# Altium footprint library SOURIAU THD.PcbLib: 34 footprints (part 4 of 5)
Each footprint in its own frame and in the unit in brackets; x right, y up, seen from the top. Pads: shape width x height; smd on the part's side, far side on the other; paste and mask are expansions set on the pad; w line width, h text height; cw(c..) or ccw(c..) is an arc to the next point about the centre after c.
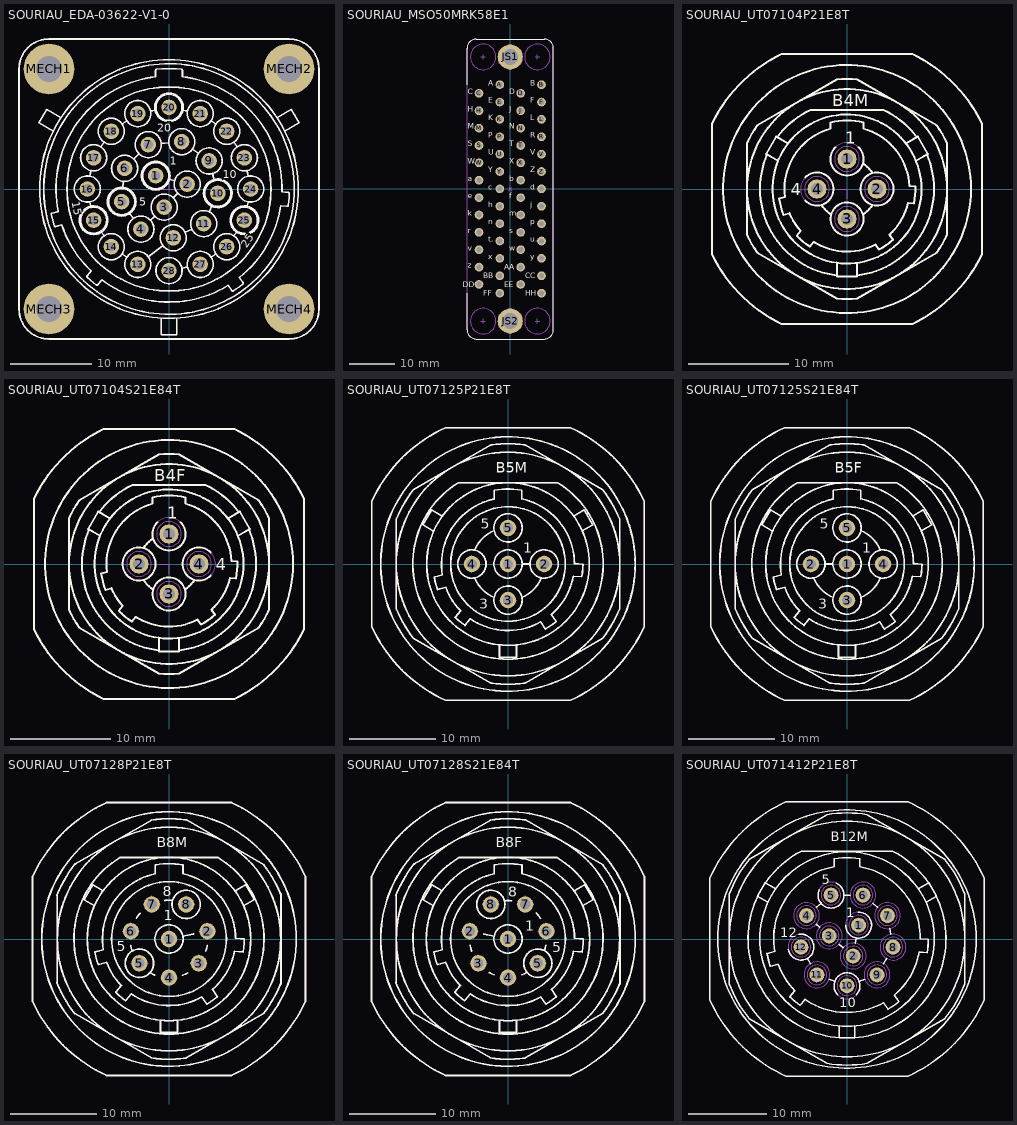
[diagram p3: the footprints below, top view; thin cyan lines are the x and y axes]

## SOURIAU_EDA-03622-V1-0 [mm] "Adapter Kit For PCB Mount For SOURIAU UTG02028P02, 28 Poles, Shell Size 20, Metalok Bantam Circular Male Connecteur"
height 37.35
pads (32):
  round 1.9 hole 1.2: 1(-1.626,1.626) 2(2.222,0.595) 3(-0.595,-2.222) 4(-3.441,-4.915) 5(-5.796,-1.553) 6(-5.438,2.536) 7(-2.536,5.438) 8(1.553,5.796) 9(4.915,3.441) 10(5.977,-0.523) 11(4.243,-4.243) 12(0.523,-5.977) 13(-3.827,-9.239) 14(-7.071,-7.071) 15(-9.239,-3.827) 16(-10,0) 17(-9.239,3.827) 18(-7.071,7.071) 19(-3.827,9.239) 20(0,10) 21(3.827,9.239) 22(7.071,7.071) 23(9.239,3.827) 24(10,0) 25(9.239,-3.827) 26(7.071,-7.071) 27(3.827,-9.239) 28(0,-10)
  round 6.2 hole 3.2: MECH1(-14.7,14.7) MECH2(14.7,14.7) MECH3(-14.7,-14.7) MECH4(14.7,-14.7)
Top Overlay:
  circle w0.2: c0,0 r15.85
  circle w0.2: c0,0 r15.35
  circle w0.2: c0,0 r12.5
  circle w0.2: c-3.827,-9.239 r1.6
  circle w0.2: c0,-10 r1.6
  circle w0.2: c3.827,-9.239 r1.6
  circle w0.2: c7.071,-7.071 r1.6
  circle w0.2: c10,0 r1.6
  circle w0.2: c9.239,3.827 r1.6
  circle w0.2: c7.071,7.071 r1.6
  circle w0.2: c3.827,9.239 r1.6
  circle w0.2: c0,10 r1.6
  circle w0.2: c-3.827,9.239 r1.6
  circle w0.2: c-7.071,7.071 r1.6
  circle w0.2: c-9.239,3.827 r1.6
  circle w0.2: c-10,0 r1.6
  circle w0.2: c-9.239,-3.827 r1.6
  circle w0.2: c-7.071,-7.071 r1.6
  circle w0.2: c0.523,-5.977 r1.6
  circle w0.2: c-3.441,-4.915 r1.6
  circle w0.2: c-5.796,-1.553 r1.6
  circle w0.2: c-5.438,2.536 r1.6
  circle w0.2: c-2.536,5.438 r1.6
  circle w0.2: c1.553,5.796 r1.6
  circle w0.2: c4.915,3.441 r1.6
  circle w0.2: c5.977,-0.523 r1.6
  circle w0.2: c4.243,-4.243 r1.6
  circle w0.2: c-0.595,-2.222 r1.6
  circle w0.2: c2.222,0.595 r1.6
  circle w0.2: c-1.626,1.626 r1.6
  circle w0.2: c-1.626,1.626 r1.75
  circle w0.2: c-5.796,-1.553 r1.75
  lines w0.2: -14.175,7.093 -15.931,8.107 -14.986,9.743 -13.23,8.729 ; -10.849,-3.142 ccw(c-9.239,-3.827) -10.452,-2.566 ; -9.688,-1.569 -9.58,-2.11 ; -9.688,1.569 -9.551,2.258 ; -8.35,5.157 -7.96,5.741 ; -8.267,-5.282 -7.96,-5.741 ; -5.741,-7.96 -5.157,-8.35 ; -5.741,7.96 -5.157,8.35 ; -5.643,0.19 -5.577,0.942 ; -4.792,-2.986 -4.359,-3.604 ; -4.306,3.667 -3.667,4.306 ; -2.547,-8.279 -0.757,-6.937 ; -2.279,-3.815 -1.757,-3.321 ; -2.258,9.551 -1.716,9.659 ; -0.945,-15.822 -0.945,-17.85 0.945,-17.85 0.945,-15.822 ; -0.942,5.577 -0.041,5.656 ; -0.357,8.287 cw(c0,10) 0.357,8.287 ; 0.064,1.173 0.676,1.009 ; 0.536,-1.09 1.09,-0.536 ; 1.569,-9.688 2.258,-9.551 ; 1.716,9.659 2.258,9.551 ; 1.973,-5.301 2.793,-4.919 ; 2.864,4.878 3.604,4.359 ; 4.919,-2.793 5.301,-1.973 ; 5.157,-8.35 5.741,-7.96 ; 5.157,8.35 5.741,7.96 ; 5.329,1.896 5.563,1.023 ; 6.363,1.184 ccw(c5.977,-0.523) 6.712,1.065 ; 7.96,-5.741 8.267,-5.282 ; 7.96,5.741 8.35,5.157 ; 9.205,-5.577 cw(c9.239,-3.827) 9.997,-5.404 ; 9.307,-5.425 cw(c9.239,-3.827) 9.85,-5.305 ; 9.551,2.258 9.688,1.569 ; 9.58,-2.11 9.688,-1.569 ; 13.23,8.729 14.986,9.743 15.931,8.107 14.175,7.093 ; -18.375,-14.7 ccw(c-14.7,-14.7) -14.7,-18.375 14.7,-18.375 ccw(c14.7,-14.7) 18.375,-14.7 18.375,14.7 ccw(c14.7,14.7) 14.7,18.375 -14.7,18.375 ccw(c-14.7,14.7) -18.375,14.7 -18.375,-14.7 ; -14.414,-3.13 ccw(c0,0) -14.048,-4.496 ccw(c-13.905,-4.451) -13.866,-4.595 -13.133,-4.399 ccw(c0,0) -9.537,-10.043 -10.025,-10.625 ccw(c-9.91,-10.721) -10.012,-10.832 ccw(c0,0) -8.928,-11.741 ccw(c-8.838,-11.621) -8.723,-11.718 -8.235,-11.136 ccw(c0,0) 7.233,-11.811 7.668,-12.433 ccw(c7.791,-12.347) 7.871,-12.474 ccw(c0,0) 9.03,-11.663 ccw(c8.938,-11.544) 9.061,-11.458 8.625,-10.836 ccw(c0,0) 13.697,-2.052 14.454,-2.118 ccw(c14.467,-1.968) 14.615,-1.989 ccw(c0,0) 14.739,-0.58 ccw(c14.589,-0.574) 14.602,-0.424 13.845,-0.358 ccw(c0,0) 1.65,13.751 1.65,14.523 ccw(c1.5,14.523) 1.515,14.672 ccw(c0,0) -1.515,14.672 ccw(c-1.5,14.523) -1.65,14.523 -1.65,13.751 ccw(c0,0) -13.573,-2.757 -14.306,-2.953 ccw(c-14.267,-3.098) -14.414,-3.13
  text "1" at 0.093,2.965 h1
  text "10" at 6.613,1.315 h1
  text "5" at -3.629,-2.053 h1
  text "20" at -1.47,7.037 h1
  text "15" at -11.906,-1.638 h1
  text "25" at 9.524,-7.34 h1
Mechanical 8:
  circle w0.1: c-14.7,14.7 r1.6
  circle w0.1: c14.7,14.7 r1.6
  circle w0.1: c14.7,-14.7 r1.6
  circle w0.1: c-14.7,-14.7 r1.6
  lines w0.1: -15.2,-14.7 -14.7,-14.7 ; -15.2,14.7 -14.7,14.7 ; -14.7,-15.2 -14.7,-14.7 ; -14.7,-14.2 -14.7,-14.7 ; -14.7,14.2 -14.7,14.7 ; -14.7,15.2 -14.7,14.7 ; -14.2,-14.7 -14.7,-14.7 ; -14.2,14.7 -14.7,14.7 ; -10.5,0 -10,0 ; -10,-0.5 -10,0 ; -10,0.5 -10,0 ; -9.739,-3.827 -9.239,-3.827 ; -9.739,3.827 -9.239,3.827 ; -9.5,0 -10,0 ; -9.239,-4.327 -9.239,-3.827 ; -9.239,-3.327 -9.239,-3.827 ; -9.239,3.327 -9.239,3.827 ; -9.239,4.327 -9.239,3.827 ; -8.739,-3.827 -9.239,-3.827 ; -8.739,3.827 -9.239,3.827 ; -7.571,-7.071 -7.071,-7.071 ; -7.571,7.071 -7.071,7.071 ; -7.071,-7.571 -7.071,-7.071 ; -7.071,-6.571 -7.071,-7.071 ; -7.071,6.571 -7.071,7.071 ; -7.071,7.571 -7.071,7.071 ; -6.571,-7.071 -7.071,-7.071 ; -6.571,7.071 -7.071,7.071 ; -6.296,-1.553 -5.796,-1.553 ; -5.938,2.536 -5.438,2.536 ; -5.796,-2.053 -5.796,-1.553 ; -5.796,-1.053 -5.796,-1.553 ; -5.438,2.036 -5.438,2.536 ; -5.438,3.036 -5.438,2.536 ; -5.296,-1.553 -5.796,-1.553 ; -4.938,2.536 -5.438,2.536 ; -4.327,-9.239 -3.827,-9.239 ; -4.327,9.239 -3.827,9.239 ; -3.941,-4.915 -3.441,-4.915 ; -3.827,-9.739 -3.827,-9.239 ; -3.827,-8.739 -3.827,-9.239 ; -3.827,8.739 -3.827,9.239 ; -3.827,9.739 -3.827,9.239 ; -3.441,-5.415 -3.441,-4.915 ; -3.441,-4.415 -3.441,-4.915 ; -3.327,-9.239 -3.827,-9.239 ; -3.327,9.239 -3.827,9.239 ; -3.036,5.438 -2.536,5.438 ; -2.941,-4.915 -3.441,-4.915 ; -2.536,4.938 -2.536,5.438 ; -2.536,5.938 -2.536,5.438 ; -2.126,1.626 -1.626,1.626 ; -2.036,5.438 -2.536,5.438 ; -1.626,1.126 -1.626,1.626 ; -1.626,2.126 -1.626,1.626 ; -1.126,1.626 -1.626,1.626 ; -1.095,-2.222 -0.595,-2.222 ; -1,0 0,0 ; -0.595,-2.722 -0.595,-2.222 ; -0.595,-1.722 -0.595,-2.222 ; -0.5,-10 0,-10 ; -0.5,10 0,10 ; -0.095,-2.222 -0.595,-2.222 ; 0,-10.5 0,-10 ; 0,-9.5 0,-10 ; 0,1 0,0 ; 0,9.5 0,10 ; 0,10.5 0,10 ; 0.023,-5.977 0.523,-5.977 ; 0.5,-10 0,-10 ; 0.5,10 0,10 ; 0.523,-6.477 0.523,-5.977 ; 0.523,-5.477 0.523,-5.977 ; 1,0 0,0 ; 1.023,-5.977 0.523,-5.977 ; 1.053,5.796 1.553,5.796 ; 1.553,5.296 1.553,5.796 ; 1.553,6.296 1.553,5.796 ; 1.722,0.595 2.222,0.595 ; 2.053,5.796 1.553,5.796 ; 2.222,0.095 2.222,0.595 ; 2.222,1.095 2.222,0.595 ; 2.722,0.595 2.222,0.595 ; 3.327,-9.239 3.827,-9.239 ; 3.327,9.239 3.827,9.239 ; 3.743,-4.243 4.243,-4.243 ; 3.827,-9.739 3.827,-9.239 ; 3.827,-8.739 3.827,-9.239 ; 3.827,8.739 3.827,9.239 ; 3.827,9.739 3.827,9.239 ; 4.243,-4.743 4.243,-4.243 ; 4.243,-3.743 4.243,-4.243 ; 4.327,-9.239 3.827,-9.239 ; 4.327,9.239 3.827,9.239 ; 4.415,3.441 4.915,3.441 ; 4.743,-4.243 4.243,-4.243 ; 4.915,2.941 4.915,3.441 ; 4.915,3.941 4.915,3.441 ; 5.415,3.441 4.915,3.441 ; 5.477,-0.523 5.977,-0.523 ; 5.977,-1.023 5.977,-0.523 ; 5.977,-0.023 5.977,-0.523 ; 6.477,-0.523 5.977,-0.523 ; 6.571,-7.071 7.071,-7.071 ; 6.571,7.071 7.071,7.071 ; 7.071,-7.571 7.071,-7.071 ; 7.071,-6.571 7.071,-7.071 ; 7.071,6.571 7.071,7.071 ; 7.071,7.571 7.071,7.071 ; 7.571,-7.071 7.071,-7.071 ; 7.571,7.071 7.071,7.071 ; 8.739,-3.827 9.239,-3.827 ; 8.739,3.827 9.239,3.827 ; 9.239,-4.327 9.239,-3.827 ; 9.239,-3.327 9.239,-3.827 ; 9.239,3.327 9.239,3.827 ; 9.239,4.327 9.239,3.827 ; 9.5,0 10,0 ; 9.739,-3.827 9.239,-3.827 ; 9.739,3.827 9.239,3.827 ; 10,-0.5 10,0 ; 10,0.5 10,0 ; 10.5,0 10,0 ; 14.2,-14.7 14.7,-14.7 ; 14.2,14.7 14.7,14.7 ; 14.7,-15.2 14.7,-14.7 ; 14.7,-14.2 14.7,-14.7 ; 14.7,14.2 14.7,14.7 ; 14.7,15.2 14.7,14.7 ; 15.2,-14.7 14.7,-14.7 ; 15.2,14.7 14.7,14.7
Mechanical 14:
  drawing of 167 lines, arcs and shapes, not listed
  text "1" at 0.093,2.965 h1
  text "10" at 6.613,1.315 h1
  text "5" at -3.629,-2.053 h1
  text "20" at -1.47,7.037 h1
  text "15" at -11.906,-1.638 h1
  text "25" at 9.524,-7.34 h1
3D body "SOURIAU_EDA-03622-V1-0.stp": height 37, standoff -13.8, extent -18.375,-18.375 18.375,18.375

## SOURIAU_MSO50MRK58E1 [mm] "Straight Rectangular Boardmount Receptacle with Jackscrew Hardware, MSO Series"
height 13
pads (52):
  round 1.9 hole 1.2: A(-2.285,22.86) a.(-6.855,1.905) AA(2.285,-17.145) B(6.855,22.86) b.(2.285,1.905) BB(-2.285,-19.05) C(-6.855,20.955) c.(-2.285,0) CC(6.855,-19.05) D(2.285,20.955) d.(6.855,0) DD(-6.855,-20.955) E(-2.285,19.05) e.(-6.855,-1.905) EE(2.285,-20.955) F(6.855,19.05) f.(2.285,-1.905) FF(-2.285,-22.86) H(-6.855,17.145) h.(-2.285,-3.81) HH(6.855,-22.86) J(2.285,17.145) j.(6.855,-3.81) K(-2.285,15.24) k.(-6.855,-5.715) L(6.855,15.24) M(-6.855,13.335) m.(2.285,-5.715) N(2.285,13.335) n.(-2.285,-7.62) P(-2.285,11.43) p.(6.855,-7.62) R(6.855,11.43) r.(-6.855,-9.525) S(-6.855,9.525) s.(2.285,-9.525) T(2.285,9.525) t.(-2.285,-11.43) U(-2.285,7.62) u.(6.855,-11.43) V(6.855,7.62) v.(-6.855,-13.335) W(-6.855,5.715) w.(2.285,-13.335) X(2.285,5.715) x.(-2.285,-15.24) Y(-2.285,3.81) y.(6.855,-15.24) Z(6.855,3.81) z.(-6.855,-17.145)
  round 5.5 hole 3.5: JS1(0,28.955) JS2(0,-28.995)
Top Overlay:
  lines w0.2: -9.45,-22.86 -9.45,-30.92 ccw(c-7.45,-30.92) -7.45,-32.92 7.45,-32.92 ccw(c7.45,-30.92) 9.45,-30.92 9.45,30.88 ccw(c7.45,30.88) 7.45,32.88 -7.45,32.88 ccw(c-7.45,30.88) -9.45,30.88 -9.45,22.86
  text "HH" at 3.3,-23.42 h1.2
  text "EE" at -1.3,-21.53 h1.2
  text "FF" at -5.87,-23.435 h1.2
  text "DD" at -10.44,-21.53 h1.2
  text "CC" at 3.3,-19.625 h1.2
  text "BB" at -5.87,-19.625 h1.2
  text "AA" at -1.3,-17.72 h1.2
  text "z" at -9.345,-17.325 h1.2
  text "y" at 4.365,-15.42 h1.2
  text "x" at -4.775,-15.42 h1.2
  text "w" at -0.205,-13.515 h1.2
  text "v" at -9.345,-13.515 h1.2
  text "u." at 4.365,-11.61 h1.2
  text "t." at -4.775,-11.61 h1.2
  text "r" at -9.345,-9.705 h1.2
  text "A" at -4.775,22.68 h1.2
  text "B" at 4.365,22.68 h1.2
  text "C" at -9.345,20.775 h1.2
  text "D" at -0.205,20.775 h1.2
  text "E" at -4.775,18.87 h1.2
  text "F" at 4.365,18.87 h1.2
  text "H" at -9.345,16.965 h1.2
  text "J" at -0.205,16.965 h1.2
  text "K" at -4.775,15.06 h1.2
  text "L" at 4.365,15.06 h1.2
  text "M" at -9.345,13.155 h1.2
  text "N" at -0.205,13.155 h1.2
  text "P" at -4.775,11.25 h1.2
  text "R" at 4.365,11.25 h1.2
  text "S" at -9.345,9.345 h1.2
  text "T" at -0.205,9.345 h1.2
  text "U" at -4.775,7.44 h1.2
  text "V" at 4.365,7.44 h1.2
  text "W" at -9.345,5.535 h1.2
  text "X" at -0.205,5.535 h1.2
  text "Y" at -4.775,3.63 h1.2
  text "Z" at 4.365,3.63 h1.2
  text "a" at -9.345,1.725 h1.2
  text "b" at -0.205,1.725 h1.2
  text "c" at -4.775,-0.18 h1.2
  text "d" at 4.365,-0.18 h1.2
  text "e" at -9.345,-2.085 h1.2
  text "f" at -0.205,-2.085 h1.2
  text "h" at -4.775,-3.99 h1.2
  text "j" at 4.365,-3.99 h1.2
  text "k" at -9.345,-5.895 h1.2
  text "m" at -0.205,-5.895 h1.2
  text "n" at -4.775,-7.8 h1.2
  text "p" at 4.365,-7.8 h1.2
  text "s" at -0.205,-9.705 h1.2
Mechanical 8:
  drawing of 230 lines, arcs and shapes, not listed
  text "A" at -3.635,22.441 h0.84
Mechanical 14:
  circle w0.1: c-5.94,-28.995 r2.8
  circle w0.1: c5.94,-28.995 r2.8
  circle w0.1: c-5.94,28.955 r2.8
  circle w0.1: c5.94,28.955 r2.8
  lines w0.1: -9.45,-30.92 ccw(c-7.45,-30.92) -7.45,-32.92 7.45,-32.92 ccw(c7.45,-30.92) 9.45,-30.92 9.45,30.88 ccw(c7.45,30.88) 7.45,32.88 -7.45,32.88 ccw(c-7.45,30.88) -9.45,30.88 -9.45,-30.92 ; -2.425,-30.395 -2.425,-27.595 0,-26.195 2.425,-27.595 2.425,-30.395 0,-31.795 -2.425,-30.395 ; -2.425,27.555 -2.425,30.355 0,31.755 2.425,30.355 2.425,27.555 0,26.155 -2.425,27.555
  text "HH" at 3.3,-23.42 h1.2
  text "EE" at -1.3,-21.53 h1.2
  text "FF" at -5.87,-23.435 h1.2
  text "DD" at -10.44,-21.53 h1.2
  text "CC" at 3.3,-19.625 h1.2
  text "BB" at -5.87,-19.625 h1.2
  text "AA" at -1.3,-17.72 h1.2
  text "z" at -9.345,-17.325 h1.2
  text "y" at 4.365,-15.42 h1.2
  text "x" at -4.775,-15.42 h1.2
  text "w" at -0.205,-13.515 h1.2
  text "v" at -9.345,-13.515 h1.2
  text "u." at 4.365,-11.61 h1.2
  text "t." at -4.775,-11.61 h1.2
  text "r" at -9.345,-9.705 h1.2
  text "A" at -4.775,22.68 h1.2
  text "B" at 4.365,22.68 h1.2
  text "C" at -9.345,20.775 h1.2
  text "D" at -0.205,20.775 h1.2
  text "E" at -4.775,18.87 h1.2
  text "F" at 4.365,18.87 h1.2
  text "H" at -9.345,16.965 h1.2
  text "J" at -0.205,16.965 h1.2
  text "K" at -4.775,15.06 h1.2
  text "L" at 4.365,15.06 h1.2
  text "M" at -9.345,13.155 h1.2
  text "N" at -0.205,13.155 h1.2
  text "P" at -4.775,11.25 h1.2
  text "R" at 4.365,11.25 h1.2
  text "S" at -9.345,9.345 h1.2
  text "T" at -0.205,9.345 h1.2
  text "U" at -4.775,7.44 h1.2
  text "V" at 4.365,7.44 h1.2
  text "W" at -9.345,5.535 h1.2
  text "X" at -0.205,5.535 h1.2
  text "Y" at -4.775,3.63 h1.2
  text "Z" at 4.365,3.63 h1.2
  text "a" at -9.345,1.725 h1.2
  text "b" at -0.205,1.725 h1.2
  text "c" at -4.775,-0.18 h1.2
  text "d" at 4.365,-0.18 h1.2
  text "e" at -9.345,-2.085 h1.2
  text "f" at -0.205,-2.085 h1.2
  text "h" at -4.775,-3.99 h1.2
  text "j" at 4.365,-3.99 h1.2
  text "k" at -9.345,-5.895 h1.2
  text "m" at -0.205,-5.895 h1.2
  text "n" at -4.775,-7.8 h1.2
  text "p" at 4.365,-7.8 h1.2
  text "s" at -0.205,-9.705 h1.2
3D body "SOURIAU_MSO50MRK58E1.stp": height 17.7, standoff -5.95, extent -9.45,-32.92 9.45,32.88

## SOURIAU_UT07104P21E8T [mm] "Metal Circular Connector, 4 Male Contacts, Shell Size 10, UT07 Series"
height 31.7
pads (4):
  round 1.9 hole 1.2: 1(0,3) 2(3,0) 3(0,-3) 4(-3,0)
Top Overlay:
  circle w0.2: c0,0 r7.45
  circle w0.2: c0,0 r10
  circle w0.2: c0,0 r12.4
  circle w0.2: c0,-3 r1.65
  circle w0.2: c3,0 r1.65
  lines w0.2: -7.984,3.455 ccw(c0,0) -1,-8.642 ; -6.984,5.187 cw(c0,0) -3.644,7.9 3.644,7.9 cw(c0,0) 6.984,5.187 ; -6.894,2.825 -8.078,3.509 -7.078,5.241 -5.894,4.557 ; -4.175,-1.159 ccw(c-3,0) -4.175,1.159 ; -2.546,-1.586 ccw(c0,0) -1.586,-2.546 ; -1.159,4.175 ccw(c0,3) 1.159,4.175 ; -1,-7.383 -1,-8.75 1,-8.75 1,-7.383 ; 1,-8.642 ccw(c0,0) 7.984,3.455 ; 1.586,-2.546 ccw(c0,0) 2.546,-1.586 ; 1.586,2.546 cw(c0,0) 2.546,1.586 ; 5.894,4.557 7.078,5.241 8.078,3.509 6.894,2.825 ; -13.5,-6.538 ccw(c0,0) -6.538,-13.5 6.538,-13.5 ccw(c0,0) 13.5,-6.538 13.5,6.538 ccw(c0,0) 6.538,13.5 -6.538,13.5 ccw(c0,0) -13.5,6.538 -13.5,-6.538 ; -10,-4.583 ccw(c0,0) -8.969,-6.369 -1.031,-10.952 ccw(c0,0) 1.031,-10.952 8.969,-6.369 ccw(c0,0) 10,-4.583 10,4.583 ccw(c0,0) 8.969,6.369 1.031,10.952 ccw(c0,0) -1.031,10.952 -8.969,6.369 ccw(c0,0) -10,4.583 -10,-4.583 ; -6.785,-0.938 ccw(c0,0) -6.345,-2.58 -5.761,-2.424 ccw(c0,0) -4.631,-4.197 -5.02,-4.66 ccw(c0,0) -3.718,-5.753 -3.329,-5.29 ccw(c0,0) 2.855,-5.56 3.202,-6.055 ccw(c0,0) 4.595,-5.08 4.248,-4.585 ccw(c0,0) 6.094,-1.386 6.697,-1.439 ccw(c0,0) 6.845,0.254 6.242,0.307 ccw(c0,0) 1.65,6.028 1.65,6.648 ccw(c0,0) -1.65,6.648 -1.65,6.028 ccw(c0,0) -6.201,-0.782 -6.785,-0.938
  text "B4M" at -1.456,8.253 h1.2
  text "1" at -0.186,4.522 h1.2
  text "4" at -5.636,-0.625 h1.2
Mechanical 8:
  circle w0.1: c0,3 r1.25
  circle w0.1: c0,3 r1.65
  circle w0.1: c3,0 r1.25
  circle w0.1: c3,0 r1.65
  circle w0.1: c0,-3 r1.25
  circle w0.1: c0,-3 r1.65
  circle w0.1: c-3,0 r1.25
  circle w0.1: c-3,0 r1.65
  lines w0.1: -3,-1 -3,0 -2,0 ; -1,0 0,0 0,-1 ; 0,-4 0,-3 1,-3 ; 0,2 0,3 1,3 ; 3,-1 3,0 4,0
Mechanical 14:
  circle w0.1: c0,0 r7.45
  circle w0.1: c0,0 r10
  circle w0.1: c0,0 r12.4
  circle w0.1: c0,-3 r1.65
  circle w0.1: c3,0 r1.65
  lines w0.1: -7.984,3.455 ccw(c0,0) -1,-8.642 ; -6.984,5.187 cw(c0,0) -3.644,7.9 3.644,7.9 cw(c0,0) 6.984,5.187 ; -6.894,2.825 -8.078,3.509 -7.078,5.241 -5.894,4.557 ; -4.175,-1.159 ccw(c-3,0) -4.175,1.159 ; -2.546,-1.586 ccw(c0,0) -1.586,-2.546 ; -1.159,4.175 ccw(c0,3) 1.159,4.175 ; -1,-7.383 -1,-8.75 1,-8.75 1,-7.383 ; 1,-8.642 ccw(c0,0) 7.984,3.455 ; 1.586,-2.546 ccw(c0,0) 2.546,-1.586 ; 1.586,2.546 cw(c0,0) 2.546,1.586 ; 5.894,4.557 7.078,5.241 8.078,3.509 6.894,2.825 ; -13.5,-6.538 ccw(c0,0) -6.538,-13.5 6.538,-13.5 ccw(c0,0) 13.5,-6.538 13.5,6.538 ccw(c0,0) 6.538,13.5 -6.538,13.5 ccw(c0,0) -13.5,6.538 -13.5,-6.538 ; -10,-4.583 ccw(c0,0) -8.969,-6.369 -1.031,-10.952 ccw(c0,0) 1.031,-10.952 8.969,-6.369 ccw(c0,0) 10,-4.583 10,4.583 ccw(c0,0) 8.969,6.369 1.031,10.952 ccw(c0,0) -1.031,10.952 -8.969,6.369 ccw(c0,0) -10,4.583 -10,-4.583 ; -6.785,-0.938 ccw(c0,0) -6.345,-2.58 -5.761,-2.424 ccw(c0,0) -4.631,-4.197 -5.02,-4.66 ccw(c0,0) -3.718,-5.753 -3.329,-5.29 ccw(c0,0) 2.855,-5.56 3.202,-6.055 ccw(c0,0) 4.595,-5.08 4.248,-4.585 ccw(c0,0) 6.094,-1.386 6.697,-1.439 ccw(c0,0) 6.845,0.254 6.242,0.307 ccw(c0,0) 1.65,6.028 1.65,6.648 ccw(c0,0) -1.65,6.648 -1.65,6.028 ccw(c0,0) -6.201,-0.782 -6.785,-0.938
  text "B4M" at -1.456,8.253 h1.2
  text "1" at -0.186,4.522 h1.2
  text "4" at -5.636,-0.625 h1.2
3D body "SOURIAU_UT07104P21E8T.stp": height 31.35, standoff -3.6, extent -13.485,-13.485 13.485,13.485
3D body "SOURIAU_UT07104P21E8T_NUT.stp": height 19.35, standoff 15.92, extent -10,-10.994 10,10.995

## SOURIAU_UT07104S21E84T [mm] "Metal Circular Connector, 4 Female Contacts, Shell Size 10, UT07 Series"
height 24.3
pads (4):
  round 1.9 hole 1.2: 1(0,3) 2(-3,0) 3(0,-3) 4(3,0)
Top Overlay:
  circle w0.2: c0,0 r7.45
  circle w0.2: c0,0 r10
  circle w0.2: c0,0 r12.4
  circle w0.2: c0,-3 r1.65
  circle w0.2: c-3,0 r1.65
  lines w0.2: -7.984,3.455 ccw(c0,0) -1,-8.642 ; -6.984,5.187 cw(c0,0) -3.644,7.9 3.644,7.9 cw(c0,0) 6.984,5.187 ; -6.894,2.825 -8.078,3.509 -7.078,5.241 -5.894,4.557 ; -2.546,1.586 cw(c0,0) -1.586,2.546 ; -2.541,-1.595 ccw(c0,0) -1.586,-2.546 ; -1.159,4.175 ccw(c0,3) 1.159,4.175 ; -1,-7.383 -1,-8.75 1,-8.75 1,-7.383 ; 1,-8.642 ccw(c0,0) 7.984,3.455 ; 1.586,-2.546 ccw(c0,0) 2.546,-1.586 ; 4.175,-1.159 cw(c3,0) 4.175,1.159 ; 5.894,4.557 7.078,5.241 8.078,3.509 6.894,2.825 ; -13.5,-6.538 ccw(c0,0) -6.538,-13.5 6.538,-13.5 ccw(c0,0) 13.5,-6.538 13.5,6.538 ccw(c0,0) 6.538,13.5 -6.538,13.5 ccw(c0,0) -13.5,6.538 -13.5,-6.538 ; -10,-4.583 ccw(c0,0) -8.969,-6.369 -1.031,-10.952 ccw(c0,0) 1.031,-10.952 8.969,-6.369 ccw(c0,0) 10,-4.583 10,4.583 ccw(c0,0) 8.969,6.369 1.031,10.952 ccw(c0,0) -1.031,10.952 -8.969,6.369 ccw(c0,0) -10,4.583 -10,-4.583 ; -6.785,-0.938 ccw(c0,0) -6.345,-2.58 -5.761,-2.424 ccw(c0,0) -4.631,-4.197 -5.02,-4.66 ccw(c0,0) -3.718,-5.753 -3.329,-5.29 ccw(c0,0) 2.855,-5.56 3.202,-6.055 ccw(c0,0) 4.595,-5.08 4.248,-4.585 ccw(c0,0) 6.094,-1.386 6.697,-1.439 ccw(c0,0) 6.845,0.254 6.242,0.307 ccw(c0,0) 1.65,6.028 1.65,6.648 ccw(c0,0) -1.65,6.648 -1.65,6.028 ccw(c0,0) -6.201,-0.782 -6.785,-0.938
  text "1" at -0.186,4.522 h1.2
  text "4" at 4.664,-0.625 h1.2
  text "B4F" at -1.456,8.253 h1.2
Mechanical 8:
  circle w0.1: c0,3 r1.25
  circle w0.1: c0,3 r1.65
  circle w0.1: c-3,0 r1.25
  circle w0.1: c-3,0 r1.65
  circle w0.1: c0,-3 r1.25
  circle w0.1: c0,-3 r1.65
  circle w0.1: c3,0 r1.25
  circle w0.1: c3,0 r1.65
  lines w0.1: -4,0 -3,0 -3,-1 ; -1,0 0,0 0,-1 ; 0,-4 0,-3 1,-3 ; 0,2 0,3 1,3 ; 2,0 3,0 3,-1
Mechanical 14:
  circle w0.1: c0,0 r7.45
  circle w0.1: c0,0 r10
  circle w0.1: c0,0 r12.4
  circle w0.1: c0,-3 r1.65
  circle w0.1: c-3,0 r1.65
  lines w0.1: -7.984,3.455 ccw(c0,0) -1,-8.642 ; -6.984,5.187 cw(c0,0) -3.644,7.9 3.644,7.9 cw(c0,0) 6.984,5.187 ; -6.894,2.825 -8.078,3.509 -7.078,5.241 -5.894,4.557 ; -2.546,1.586 cw(c0,0) -1.586,2.546 ; -2.541,-1.595 ccw(c0,0) -1.586,-2.546 ; -1.159,4.175 ccw(c0,3) 1.159,4.175 ; -1,-7.383 -1,-8.75 1,-8.75 1,-7.383 ; 1,-8.642 ccw(c0,0) 7.984,3.455 ; 1.586,-2.546 ccw(c0,0) 2.546,-1.586 ; 4.175,-1.159 cw(c3,0) 4.175,1.159 ; 5.894,4.557 7.078,5.241 8.078,3.509 6.894,2.825 ; -13.5,-6.538 ccw(c0,0) -6.538,-13.5 6.538,-13.5 ccw(c0,0) 13.5,-6.538 13.5,6.538 ccw(c0,0) 6.538,13.5 -6.538,13.5 ccw(c0,0) -13.5,6.538 -13.5,-6.538 ; -10,-4.583 ccw(c0,0) -8.969,-6.369 -1.031,-10.952 ccw(c0,0) 1.031,-10.952 8.969,-6.369 ccw(c0,0) 10,-4.583 10,4.583 ccw(c0,0) 8.969,6.369 1.031,10.952 ccw(c0,0) -1.031,10.952 -8.969,6.369 ccw(c0,0) -10,4.583 -10,-4.583 ; -6.785,-0.938 ccw(c0,0) -6.345,-2.58 -5.761,-2.424 ccw(c0,0) -4.631,-4.197 -5.02,-4.66 ccw(c0,0) -3.718,-5.753 -3.329,-5.29 ccw(c0,0) 2.855,-5.56 3.202,-6.055 ccw(c0,0) 4.595,-5.08 4.248,-4.585 ccw(c0,0) 6.094,-1.386 6.697,-1.439 ccw(c0,0) 6.845,0.254 6.242,0.307 ccw(c0,0) 1.65,6.028 1.65,6.648 ccw(c0,0) -1.65,6.648 -1.65,6.028 ccw(c0,0) -6.201,-0.782 -6.785,-0.938
  text "1" at -0.186,4.522 h1.2
  text "4" at 4.664,-0.625 h1.2
  text "B4F" at -1.456,8.253 h1.2
3D body "SOURIAU_UT07104S21E84T.stp": height 23.75, standoff -3.6, extent -13.485,-13.485 13.485,13.485
3D body "SOURIAU_UT07104S21E84T_NUT.stp": height 11.75, standoff 8.32, extent -10,-10.994 10,10.995
